# Altium footprint library Custom1.PcbLib: 554 footprints (part 25 of 35)
Each footprint in its own frame and in the unit in brackets; x right, y up, seen from the top. Pads: shape width x height; smd on the part's side, far side on the other; paste and mask are expansions set on the pad; w line width, h text height; cw(c..) or ccw(c..) is an arc to the next point about the centre after c.
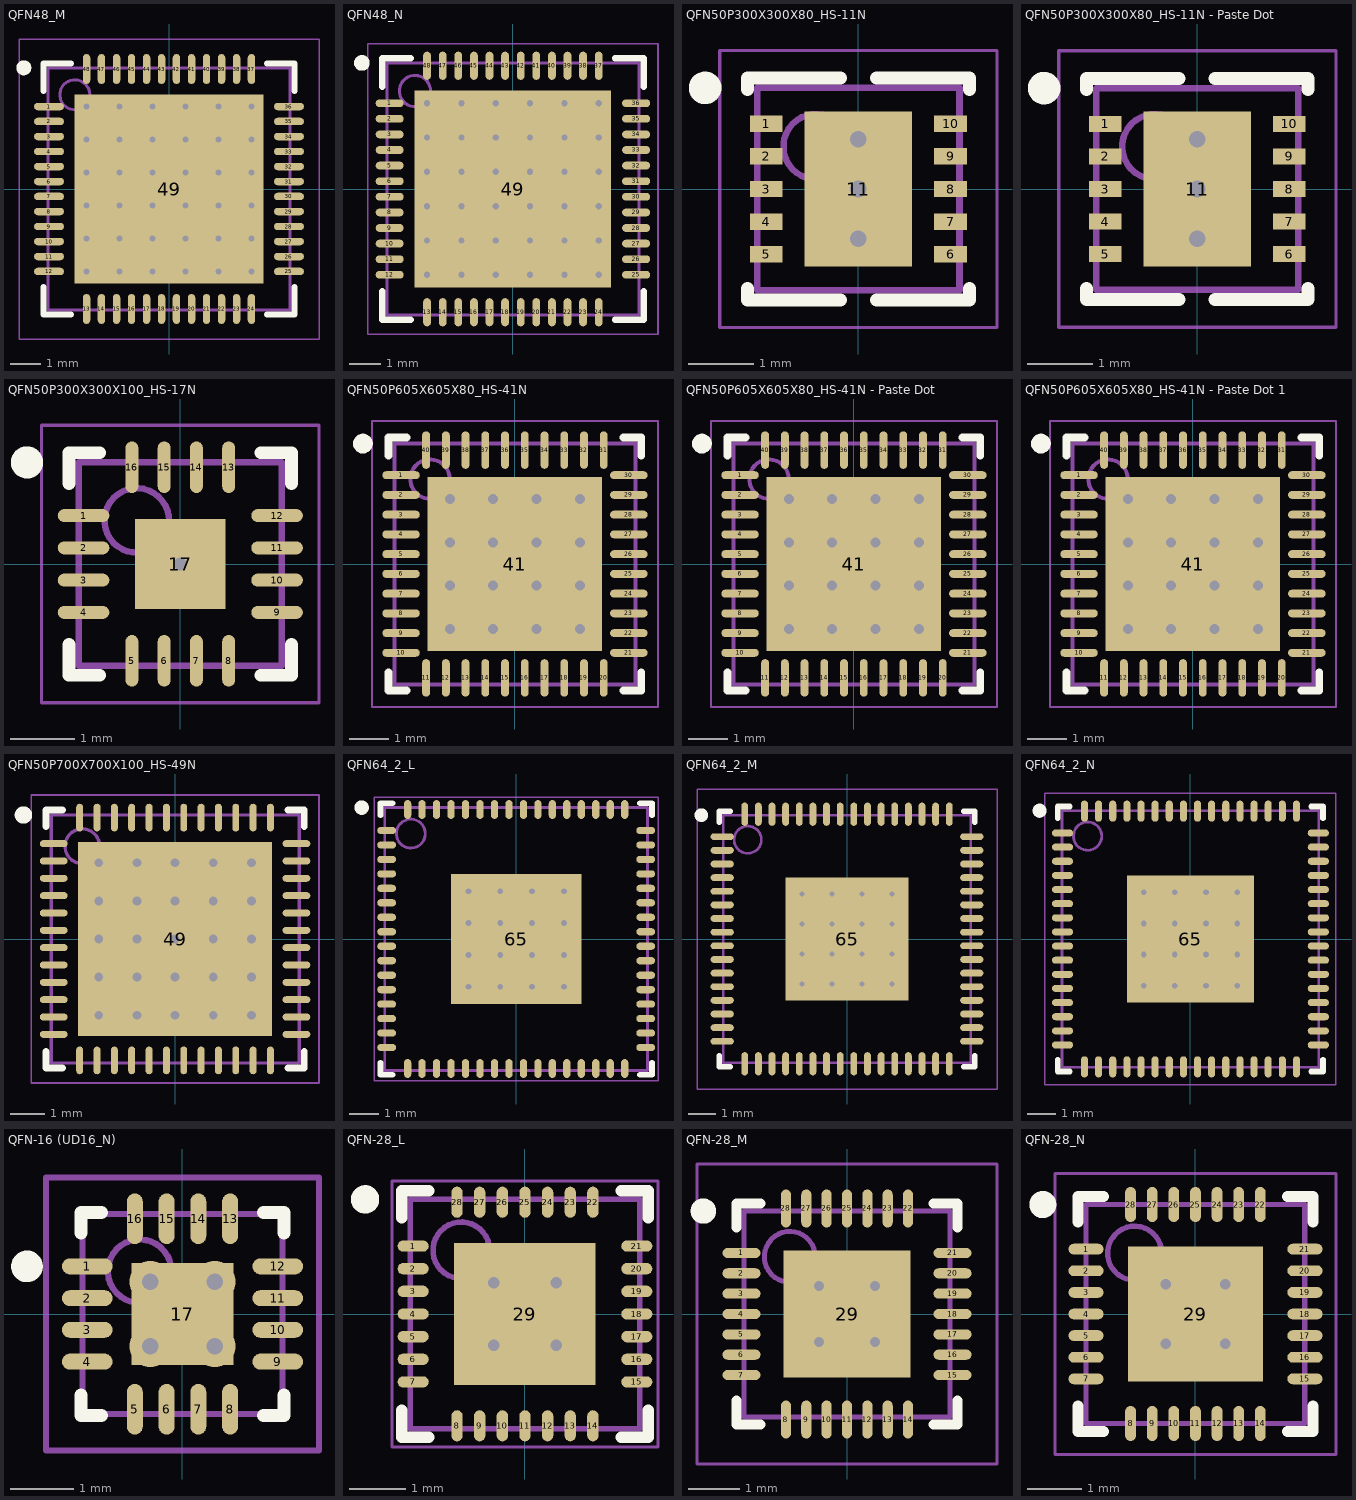
[diagram p24: the footprints below, top view; thin cyan lines are the x and y axes]

## QFN48_M [mm] "QFN, 48-Leads, Body 8x8mm, Pitch 0.5mm, Thermal Pad 6.3x6.3mm, IPC Low Density"
height 1
pads (49):
  oval 1x0.25 smd: 1(-4,2.75) 2(-4,2.25) 3(-4,1.75) 4(-4,1.25) 5(-4,0.75) 6(-4,0.25) 7(-4,-0.25) 8(-4,-0.75) 9(-4,-1.25) 10(-4,-1.75) 11(-4,-2.25) 12(-4,-2.75) 25(4,-2.75) 26(4,-2.25) 27(4,-1.75) 28(4,-1.25) 29(4,-0.75) 30(4,-0.25) 31(4,0.25) 32(4,0.75) 33(4,1.25) 34(4,1.75) 35(4,2.25) 36(4,2.75)
  oval 0.25x1 smd: 13(-2.75,-4) 14(-2.25,-4) 15(-1.75,-4) 16(-1.25,-4) 17(-0.75,-4) 18(-0.25,-4) 19(0.25,-4) 20(0.75,-4) 21(1.25,-4) 22(1.75,-4) 23(2.25,-4) 24(2.75,-4) 37(2.75,4) 38(2.25,4) 39(1.75,4) 40(1.25,4) 41(0.75,4) 42(0.25,4) 43(-0.25,4) 44(-0.75,4) 45(-1.25,4) 46(-1.75,4) 47(-2.25,4) 48(-2.75,4)
  rect 6.3x6.3 smd: 49(0,0)
via -2.75,2.75 diameter 0.5 hole 0.2
via -1.65,2.75 diameter 0.5 hole 0.2
via -0.55,2.75 diameter 0.5 hole 0.2
via 0.55,2.75 diameter 0.5 hole 0.2
via 1.65,2.75 diameter 0.5 hole 0.2
via 2.75,2.75 diameter 0.5 hole 0.2
via -2.75,1.65 diameter 0.5 hole 0.2
via -1.65,1.65 diameter 0.5 hole 0.2
via -0.55,1.65 diameter 0.5 hole 0.2
via 0.55,1.65 diameter 0.5 hole 0.2
via 1.65,1.65 diameter 0.5 hole 0.2
via 2.75,1.65 diameter 0.5 hole 0.2
via -2.75,0.55 diameter 0.5 hole 0.2
via -1.65,0.55 diameter 0.5 hole 0.2
via -0.55,0.55 diameter 0.5 hole 0.2
via 0.55,0.55 diameter 0.5 hole 0.2
via 1.65,0.55 diameter 0.5 hole 0.2
via 2.75,0.55 diameter 0.5 hole 0.2
via -2.75,-0.55 diameter 0.5 hole 0.2
via -1.65,-0.55 diameter 0.5 hole 0.2
via -0.55,-0.55 diameter 0.5 hole 0.2
via 0.55,-0.55 diameter 0.5 hole 0.2
via 1.65,-0.55 diameter 0.5 hole 0.2
via 2.75,-0.55 diameter 0.5 hole 0.2
via -2.75,-1.65 diameter 0.5 hole 0.2
via -1.65,-1.65 diameter 0.5 hole 0.2
via -0.55,-1.65 diameter 0.5 hole 0.2
via 0.55,-1.65 diameter 0.5 hole 0.2
via 1.65,-1.65 diameter 0.5 hole 0.2
via 2.75,-1.65 diameter 0.5 hole 0.2
via -2.75,-2.75 diameter 0.5 hole 0.2
via -1.65,-2.75 diameter 0.5 hole 0.2
via -0.55,-2.75 diameter 0.5 hole 0.2
via 0.55,-2.75 diameter 0.5 hole 0.2
via 1.65,-2.75 diameter 0.5 hole 0.2
via 2.75,-2.75 diameter 0.5 hole 0.2
Top Overlay:
  circle w0.25: c-4.84,4.04 r0.125
  lines w0.2: -4.19,-3.275 -4.19,-4.19 -3.275,-4.19 ; -4.19,3.275 -4.19,4.19 -3.275,4.19 ; 3.275,-4.19 4.19,-4.19 4.19,-3.275 ; 3.275,4.19 4.19,4.19 4.19,3.275
Mechanical 13:
  circle w0.1: c-3.14,3.14 r0.5
  lines w0.1: -4.04,-4.04 -4.04,4.04 4.04,4.04 4.04,-4.04 -4.04,-4.04
Mechanical 15:
  lines w0.05: -5,-5 -5,5 5,5 5,-5 -5,-5
  lines w0.1: -0.5,0 0.5,0 ; 0,-0.5 0,0.5
3D body: height 1, standoff 0, extent -4.04,-4.04 4.04,4.04

## QFN48_N [mm] "QFN, 48-Leads, Body 8x8mm, Pitch 0.5mm, Thermal Pad 6.3x6.3mm, IPC Medium Density"
height 1
pads (49):
  oval 0.9x0.25 smd: 1(-3.95,2.75) 2(-3.95,2.25) 3(-3.95,1.75) 4(-3.95,1.25) 5(-3.95,0.75) 6(-3.95,0.25) 7(-3.95,-0.25) 8(-3.95,-0.75) 9(-3.95,-1.25) 10(-3.95,-1.75) 11(-3.95,-2.25) 12(-3.95,-2.75) 25(3.95,-2.75) 26(3.95,-2.25) 27(3.95,-1.75) 28(3.95,-1.25) 29(3.95,-0.75) 30(3.95,-0.25) 31(3.95,0.25) 32(3.95,0.75) 33(3.95,1.25) 34(3.95,1.75) 35(3.95,2.25) 36(3.95,2.75)
  oval 0.25x0.9 smd: 13(-2.75,-3.95) 14(-2.25,-3.95) 15(-1.75,-3.95) 16(-1.25,-3.95) 17(-0.75,-3.95) 18(-0.25,-3.95) 19(0.25,-3.95) 20(0.75,-3.95) 21(1.25,-3.95) 22(1.75,-3.95) 23(2.25,-3.95) 24(2.75,-3.95) 37(2.75,3.95) 38(2.25,3.95) 39(1.75,3.95) 40(1.25,3.95) 41(0.75,3.95) 42(0.25,3.95) 43(-0.25,3.95) 44(-0.75,3.95) 45(-1.25,3.95) 46(-1.75,3.95) 47(-2.25,3.95) 48(-2.75,3.95)
  rect 6.3x6.3 smd: 49(0,0)
via -2.75,2.75 diameter 0.5 hole 0.2
via -1.65,2.75 diameter 0.5 hole 0.2
via -0.55,2.75 diameter 0.5 hole 0.2
via 0.55,2.75 diameter 0.5 hole 0.2
via 1.65,2.75 diameter 0.5 hole 0.2
via 2.75,2.75 diameter 0.5 hole 0.2
via -2.75,1.65 diameter 0.5 hole 0.2
via -1.65,1.65 diameter 0.5 hole 0.2
via -0.55,1.65 diameter 0.5 hole 0.2
via 0.55,1.65 diameter 0.5 hole 0.2
via 1.65,1.65 diameter 0.5 hole 0.2
via 2.75,1.65 diameter 0.5 hole 0.2
via -2.75,0.55 diameter 0.5 hole 0.2
via -1.65,0.55 diameter 0.5 hole 0.2
via -0.55,0.55 diameter 0.5 hole 0.2
via 0.55,0.55 diameter 0.5 hole 0.2
via 1.65,0.55 diameter 0.5 hole 0.2
via 2.75,0.55 diameter 0.5 hole 0.2
via -2.75,-0.55 diameter 0.5 hole 0.2
via -1.65,-0.55 diameter 0.5 hole 0.2
via -0.55,-0.55 diameter 0.5 hole 0.2
via 0.55,-0.55 diameter 0.5 hole 0.2
via 1.65,-0.55 diameter 0.5 hole 0.2
via 2.75,-0.55 diameter 0.5 hole 0.2
via -2.75,-1.65 diameter 0.5 hole 0.2
via -1.65,-1.65 diameter 0.5 hole 0.2
via -0.55,-1.65 diameter 0.5 hole 0.2
via 0.55,-1.65 diameter 0.5 hole 0.2
via 1.65,-1.65 diameter 0.5 hole 0.2
via 2.75,-1.65 diameter 0.5 hole 0.2
via -2.75,-2.75 diameter 0.5 hole 0.2
via -1.65,-2.75 diameter 0.5 hole 0.2
via -0.55,-2.75 diameter 0.5 hole 0.2
via 0.55,-2.75 diameter 0.5 hole 0.2
via 1.65,-2.75 diameter 0.5 hole 0.2
via 2.75,-2.75 diameter 0.5 hole 0.2
Top Overlay:
  circle w0.25: c-4.84,4.04 r0.125
  lines w0.2: -4.19,-3.275 -4.19,-4.19 -3.275,-4.19 ; -4.19,3.275 -4.19,4.19 -3.275,4.19 ; 3.275,-4.19 4.19,-4.19 4.19,-3.275 ; 3.275,4.19 4.19,4.19 4.19,3.275
Mechanical 13:
  circle w0.1: c-3.14,3.14 r0.5
  lines w0.1: -4.04,-4.04 -4.04,4.04 4.04,4.04 4.04,-4.04 -4.04,-4.04
Mechanical 15:
  lines w0.05: -4.65,-4.65 -4.65,4.65 4.65,4.65 4.65,-4.65 -4.65,-4.65
  lines w0.1: -0.5,0 0.5,0 ; 0,-0.5 0,0.5
3D body: height 1, standoff 0, extent -4.04,-4.04 4.04,4.04

## QFN50P300X300X80_HS-11N [mm] "QFN, 10-Leads, Body 3.00x3.00mm, Pitch 0.50mm, Thermal Pad 2.38x1.65mm, IPC Medium Density"
height 0.8
pads (12):
  rect 0.025x0.025 on Mech13 paste+0 mask+0.076: 0(0,0)
  rect 0.5x0.25 smd paste-0.025 mask+0.064: 1(-1.412,1) 2(-1.412,0.5) 3(-1.412,0) 4(-1.412,-0.5) 5(-1.412,-1) 6(1.412,-1) 7(1.412,-0.5) 8(1.412,0) 9(1.412,0.5) 10(1.412,1)
  rect 1.65x2.38 smd paste-0.838 mask+0.064: 11(0,0)
via 0,-0.762 diameter 0.66 hole 0.254
via 0,0.762 diameter 0.66 hole 0.254
via 0,0 diameter 0.66 hole 0.254
Top Overlay:
  circle w0.25: c-2.35,1.55 r0.125
  lines w0.2: -1.7,-1.525 -1.7,-1.7 -0.275,-1.7 ; -1.7,1.525 -1.7,1.7 -0.275,1.7 ; 0.275,-1.7 1.7,-1.7 1.7,-1.525 ; 0.275,1.7 1.7,1.7 1.7,1.525
Top Paste:
  circle w0.254: c-0.533,0.889 r0.127
  circle w0.254: c0.533,0.889 r0.127
  circle w0.254: c0,-0.381 r0.127
  circle w0.254: c0,0.381 r0.127
  circle w0.254: c0.533,0 r0.127
  circle w0.254: c-0.533,0 r0.127
  circle w0.254: c-0.533,-0.889 r0.127
  circle w0.254: c0.533,-0.914 r0.127
  lines w0.254: -0.533,-1.016 -0.533,0.889 ; 0.533,-0.787 0.533,0.889
Mechanical 13:
  circle w0.1: c-0.65,0.65 r0.5
  lines w0.1: -1.55,-1.55 1.55,-1.55 1.55,1.55 -1.55,1.55 -1.55,-1.55
Mechanical 15:
  lines w0.05: -2.125,-2.125 2.125,-2.125 2.125,2.125 -2.125,2.125 -2.125,-2.125
  lines w0.1: -0.5,0 0.5,0 ; 0,-0.5 0,0.5
3D body: height 0.8, standoff 0.01, extent -1.55,-1.576 1.55,1.524

## QFN50P300X300X80_HS-11N - Paste Dot [mm] "QFN, 10-Leads, Body 3.00x3.00mm, Pitch 0.50mm, Thermal Pad 2.38x1.65mm, IPC Medium Density"
height 0.8
pads (12):
  rect 0.025x0.025 on Mech13 paste+0 mask+0.076: 0(0,0)
  rect 0.5x0.25 smd paste-0.025 mask+0.064: 1(-1.412,1) 2(-1.412,0.5) 3(-1.412,0) 4(-1.412,-0.5) 5(-1.412,-1) 6(1.412,-1) 7(1.412,-0.5) 8(1.412,0) 9(1.412,0.5) 10(1.412,1)
  rect 1.65x2.38 smd paste-1.194 mask+0.064: 11(0,0)
via 0,-0.762 diameter 0.66 hole 0.254
via 0,0.762 diameter 0.66 hole 0.254
via 0,0 diameter 0.66 hole 0.254
Top Overlay:
  circle w0.25: c-2.35,1.55 r0.125
  lines w0.2: -1.7,-1.525 -1.7,-1.7 -0.275,-1.7 ; -1.7,1.525 -1.7,1.7 -0.275,1.7 ; 0.275,-1.7 1.7,-1.7 1.7,-1.525 ; 0.275,1.7 1.7,1.7 1.7,1.525
Top Paste:
  circle w0.356: c-0.483,-0.762 r0.127
  circle w0.356: c0.483,-0.762 r0.127
  circle w0.356: c0.483,0 r0.127
  circle w0.356: c-0.483,0.762 r0.127
  circle w0.356: c-0.483,0 r0.127
  circle w0.356: c0.483,0.762 r0.127
  circle w0.254: c0,-0.381 r0.102
  circle w0.254: c0,0.381 r0.102
Mechanical 13:
  circle w0.1: c-0.65,0.65 r0.5
  lines w0.1: -1.55,-1.55 1.55,-1.55 1.55,1.55 -1.55,1.55 -1.55,-1.55
Mechanical 15:
  lines w0.05: -2.125,-2.125 2.134,-2.125 2.134,2.125 -2.125,2.125 -2.125,-2.125
  lines w0.1: -0.5,0 0.5,0 ; 0,-0.5 0,0.5
3D body: height 0.8, standoff 0.01, extent -1.55,-1.576 1.55,1.524

## QFN50P300X300X100_HS-17N [mm] "QFN, 16-Leads, Body 3.00x3.00mm, Pitch 0.50mm, Thermal Pad 1.40x1.40mm, IPC Medium Density"
height 1
pads (17):
  oval 0.8x0.2 smd: 1(-1.5,0.75) 2(-1.5,0.25) 3(-1.5,-0.25) 4(-1.5,-0.75) 9(1.5,-0.75) 10(1.5,-0.25) 11(1.5,0.25) 12(1.5,0.75)
  oval 0.2x0.8 smd: 5(-0.75,-1.5) 6(-0.25,-1.5) 7(0.25,-1.5) 8(0.75,-1.5) 13(0.75,1.5) 14(0.25,1.5) 15(-0.25,1.5) 16(-0.75,1.5)
  rect 1.4x1.4 smd: 17(0,0)
via 0,0 diameter 0.5 hole 0.2
Top Overlay:
  circle w0.25: c-2.375,1.575 r0.125
  lines w0.2: -1.725,-1.25 -1.725,-1.725 -1.25,-1.725 ; -1.725,1.25 -1.725,1.725 -1.25,1.725 ; 1.25,-1.725 1.725,-1.725 1.725,-1.25 ; 1.25,1.725 1.725,1.725 1.725,1.25
Mechanical 13:
  circle w0.1: c-0.675,0.675 r0.5
  lines w0.1: -1.575,-1.575 1.575,-1.575 1.575,1.575 -1.575,1.575 -1.575,-1.575
Mechanical 15:
  lines w0.05: -2.15,-2.15 2.15,-2.15 2.15,2.15 -2.15,2.15 -2.15,-2.15
  lines w0.1: -0.5,0 0.5,0 ; 0,-0.5 0,0.5
3D body: height 1, standoff 0.08, extent -1.575,-1.575 1.575,1.575

## QFN50P605X605X80_HS-41N [mm] "QFN, 40-Leads, Body 6.05x6.05mm, Pitch 0.50mm, Thermal Pad 4.42x4.42mm, IPC Medium Density"
height 0.8
pads (41):
  oval 0.95x0.2 smd paste-0.025 mask+0.051: 1(-2.885,2.25) 2(-2.885,1.75) 3(-2.885,1.25) 4(-2.885,0.75) 5(-2.885,0.25) 6(-2.885,-0.25) 7(-2.885,-0.75) 8(-2.885,-1.25) 9(-2.885,-1.75) 10(-2.885,-2.25) 21(2.885,-2.25) 22(2.885,-1.75) 23(2.885,-1.25) 24(2.885,-0.75) 25(2.885,-0.25) 26(2.885,0.25) 27(2.885,0.75) 28(2.885,1.25) 29(2.885,1.75) 30(2.885,2.25)
  oval 0.2x0.95 smd paste-0.025 mask+0.051: 11(-2.25,-2.885) 12(-1.75,-2.885) 13(-1.25,-2.885) 14(-0.75,-2.885) 15(-0.25,-2.885) 16(0.25,-2.885) 17(0.75,-2.885) 18(1.25,-2.885) 19(1.75,-2.885) 20(2.25,-2.885) 31(2.25,2.885) 32(1.75,2.885) 33(1.25,2.885) 34(0.75,2.885) 35(0.25,2.885) 36(-0.25,2.885) 37(-0.75,2.885) 38(-1.25,2.885) 39(-1.75,2.885) 40(-2.25,2.885)
  rect 4.42x4.42 smd paste-0.025 mask+0.051: 41(0,0)
via -1.65,1.65 diameter 0.66 hole 0.254
via -0.55,1.65 diameter 0.66 hole 0.254
via 0.55,1.65 diameter 0.66 hole 0.254
via 1.65,1.65 diameter 0.66 hole 0.254
via -1.65,0.55 diameter 0.66 hole 0.254
via -0.55,0.55 diameter 0.66 hole 0.254
via 0.55,0.55 diameter 0.66 hole 0.254
via 1.65,0.55 diameter 0.66 hole 0.254
via -1.65,-0.55 diameter 0.66 hole 0.254
via -0.55,-0.55 diameter 0.66 hole 0.254
via 0.55,-0.55 diameter 0.66 hole 0.254
via 1.65,-0.55 diameter 0.66 hole 0.254
via -1.65,-1.65 diameter 0.66 hole 0.254
via -0.55,-1.65 diameter 0.66 hole 0.254
via 0.55,-1.65 diameter 0.66 hole 0.254
via 1.65,-1.65 diameter 0.66 hole 0.254
Top Overlay:
  circle w0.25: c-3.85,3.05 r0.125
  lines w0.2: -3.2,-2.75 -3.2,-3.2 -2.75,-3.2 ; -3.2,2.75 -3.2,3.2 -2.75,3.2 ; 2.75,-3.2 3.2,-3.2 3.2,-2.75 ; 2.75,3.2 3.2,3.2 3.2,2.75
Mechanical 13:
  circle w0.1: c-2.15,2.15 r0.5
  lines w0.1: -3.05,-3.05 -3.05,3.05 3.05,3.05 3.05,-3.05 -3.05,-3.05
Mechanical 15:
  lines w0.05: -3.625,-3.625 -3.625,3.625 3.625,3.625 3.625,-3.625 -3.625,-3.625
  lines w0.1: -0.5,0 0.5,0 ; 0,-0.5 0,0.5
3D body: height 0.8, standoff 0, extent -3.05,-3.05 3.05,3.05

## QFN50P605X605X80_HS-41N - Paste Dot [mm] "QFN, 40-Leads, Body 6.05x6.05mm, Pitch 0.50mm, Thermal Pad 4.42x4.42mm, IPC Medium Density"
height 0.8
pads (41):
  oval 0.95x0.2 smd paste-0.025 mask+0.051: 1(-2.885,2.25) 2(-2.885,1.75) 3(-2.885,1.25) 4(-2.885,0.75) 5(-2.885,0.25) 6(-2.885,-0.25) 7(-2.885,-0.75) 8(-2.885,-1.25) 9(-2.885,-1.75) 10(-2.885,-2.25) 21(2.885,-2.25) 22(2.885,-1.75) 23(2.885,-1.25) 24(2.885,-0.75) 25(2.885,-0.25) 26(2.885,0.25) 27(2.885,0.75) 28(2.885,1.25) 29(2.885,1.75) 30(2.885,2.25)
  oval 0.2x0.95 smd paste-0.025 mask+0.051: 11(-2.25,-2.885) 12(-1.75,-2.885) 13(-1.25,-2.885) 14(-0.75,-2.885) 15(-0.25,-2.885) 16(0.25,-2.885) 17(0.75,-2.885) 18(1.25,-2.885) 19(1.75,-2.885) 20(2.25,-2.885) 31(2.25,2.885) 32(1.75,2.885) 33(1.25,2.885) 34(0.75,2.885) 35(0.25,2.885) 36(-0.25,2.885) 37(-0.75,2.885) 38(-1.25,2.885) 39(-1.75,2.885) 40(-2.25,2.885)
  rect 4.42x4.42 smd paste-2.21 mask+0.051: 41(0,0)
via -1.65,1.65 diameter 0.66 hole 0.254
via -0.55,1.65 diameter 0.66 hole 0.254
via 0.55,1.65 diameter 0.66 hole 0.254
via 1.65,1.65 diameter 0.66 hole 0.254
via -1.65,0.55 diameter 0.66 hole 0.254
via -0.55,0.55 diameter 0.66 hole 0.254
via 0.55,0.55 diameter 0.66 hole 0.254
via 1.65,0.55 diameter 0.66 hole 0.254
via -1.65,-0.55 diameter 0.66 hole 0.254
via -0.55,-0.55 diameter 0.66 hole 0.254
via 0.55,-0.55 diameter 0.66 hole 0.254
via 1.65,-0.55 diameter 0.66 hole 0.254
via -1.65,-1.65 diameter 0.66 hole 0.254
via -0.55,-1.65 diameter 0.66 hole 0.254
via 0.55,-1.65 diameter 0.66 hole 0.254
via 1.65,-1.65 diameter 0.66 hole 0.254
Top Overlay:
  circle w0.25: c-3.85,3.05 r0.125
  lines w0.2: -3.2,-2.75 -3.2,-3.2 -2.75,-3.2 ; -3.2,2.75 -3.2,3.2 -2.75,3.2 ; 2.75,-3.2 3.2,-3.2 3.2,-2.75 ; 2.75,3.2 3.2,3.2 3.2,2.75
Top Paste:
  circle w0.508: c-1.118,1.118 r0.254
  circle w0.508: c1.118,-1.118 r0.254
  circle w0.508: c0,1.118 r0.254
  circle w0.508: c1.118,1.118 r0.254
  circle w0.508: c-1.118,0 r0.254
  circle w0.508: c1.118,0 r0.254
  circle w0.508: c0,0 r0.254
  circle w0.508: c0,-1.118 r0.254
  lines w0.508: -0.864,-1.118 cw(c-1.118,-1.118) -0.864,-1.105
Mechanical 13:
  circle w0.1: c-2.15,2.15 r0.5
  lines w0.1: -3.05,-3.05 -3.05,3.05 3.05,3.05 3.05,-3.05 -3.05,-3.05
Mechanical 15:
  lines w0.05: -3.625,-3.625 -3.625,3.625 3.625,3.625 3.625,-3.625 -3.625,-3.625
  lines w0.1: -0.5,0 0.5,0 ; 0,-0.5 0,0.5
3D body: height 0.8, standoff 0, extent -3.05,-3.05 3.05,3.05

## QFN50P605X605X80_HS-41N - Paste Dot 1 [mm] "QFN, 40-Leads, Body 6.05x6.05mm, Pitch 0.50mm, Thermal Pad 4.42x4.42mm, IPC Medium Density"
height 0.8
pads (41):
  oval 0.95x0.2 smd paste-0.025 mask+0.051: 1(-2.885,2.25) 2(-2.885,1.75) 3(-2.885,1.25) 4(-2.885,0.75) 5(-2.885,0.25) 6(-2.885,-0.25) 7(-2.885,-0.75) 8(-2.885,-1.25) 9(-2.885,-1.75) 10(-2.885,-2.25) 21(2.885,-2.25) 22(2.885,-1.75) 23(2.885,-1.25) 24(2.885,-0.75) 25(2.885,-0.25) 26(2.885,0.25) 27(2.885,0.75) 28(2.885,1.25) 29(2.885,1.75) 30(2.885,2.25)
  oval 0.2x0.95 smd paste-0.025 mask+0.051: 11(-2.25,-2.885) 12(-1.75,-2.885) 13(-1.25,-2.885) 14(-0.75,-2.885) 15(-0.25,-2.885) 16(0.25,-2.885) 17(0.75,-2.885) 18(1.25,-2.885) 19(1.75,-2.885) 20(2.25,-2.885) 31(2.25,2.885) 32(1.75,2.885) 33(1.25,2.885) 34(0.75,2.885) 35(0.25,2.885) 36(-0.25,2.885) 37(-0.75,2.885) 38(-1.25,2.885) 39(-1.75,2.885) 40(-2.25,2.885)
  rect 4.42x4.42 smd paste-2.21 mask+0.051: 41(0,0)
via 1.65,-1.65 diameter 0.66 hole 0.254
via 0.55,-1.65 diameter 0.66 hole 0.254
via -0.55,-1.65 diameter 0.66 hole 0.254
via -1.65,-1.65 diameter 0.66 hole 0.254
via 1.65,-0.55 diameter 0.66 hole 0.254
via 0.55,-0.55 diameter 0.66 hole 0.254
via -0.55,-0.55 diameter 0.66 hole 0.254
via -1.65,-0.55 diameter 0.66 hole 0.254
via 1.65,0.55 diameter 0.66 hole 0.254
via 0.55,0.55 diameter 0.66 hole 0.254
via -0.55,0.55 diameter 0.66 hole 0.254
via -1.65,0.55 diameter 0.66 hole 0.254
via 1.65,1.65 diameter 0.66 hole 0.254
via 0.55,1.65 diameter 0.66 hole 0.254
via -0.55,1.65 diameter 0.66 hole 0.254
via -1.65,1.65 diameter 0.66 hole 0.254
Top Overlay:
  circle w0.25: c-3.85,3.05 r0.125
  lines w0.2: -3.2,-2.75 -3.2,-3.2 -2.75,-3.2 ; -3.2,2.75 -3.2,3.2 -2.75,3.2 ; 2.75,-3.2 3.2,-3.2 3.2,-2.75 ; 2.75,3.2 3.2,3.2 3.2,2.75
Top Paste:
  circle w0.254: c-1.651,1.092 r0.076
  circle w0.254: c-1.092,1.092 r0.127
  circle w0.254: c0,0 r0.127
  circle w0.254: c1.092,1.092 r0.127
  circle w0.254: c0,1.092 r0.127
  circle w0.254: c-1.092,-1.092 r0.127
  circle w0.254: c1.092,-1.092 r0.127
  circle w0.254: c0,-1.092 r0.127
  circle w0.254: c1.092,0 r0.127
  circle w0.254: c-1.092,0 r0.127
  circle w0.254: c1.651,-1.092 r0.076
  circle w0.254: c-1.651,0 r0.076
  circle w0.254: c1.092,1.651 r0.076
  circle w0.254: c-1.092,1.651 r0.076
  circle w0.254: c1.651,1.092 r0.076
  circle w0.254: c1.651,0 r0.076
  circle w0.254: c0,1.651 r0.076
  circle w0.254: c-1.092,0.533 r0.076
  circle w0.254: c0,0.533 r0.076
  circle w0.254: c-0.559,1.092 r0.076
  circle w0.254: c0,-1.651 r0.076
  circle w0.254: c-1.092,-1.651 r0.076
  circle w0.254: c-1.651,-1.092 r0.076
  circle w0.254: c1.092,-1.651 r0.076
  circle w0.254: c-0.559,0 r0.076
  circle w0.254: c0.559,0 r0.076
  circle w0.254: c0.559,1.092 r0.076
  circle w0.254: c1.092,0.559 r0.076
  circle w0.254: c1.092,-0.559 r0.076
  circle w0.254: c-1.092,-0.559 r0.076
  circle w0.254: c0,-0.559 r0.076
  circle w0.254: c0.559,-1.092 r0.076
  circle w0.254: c-0.559,-1.092 r0.076
Mechanical 13:
  circle w0.1: c-2.15,2.15 r0.5
  lines w0.1: -3.05,-3.05 3.05,-3.05 3.05,3.05 -3.05,3.05 -3.05,-3.05
Mechanical 15:
  lines w0.05: -3.625,-3.625 3.625,-3.625 3.625,3.625 -3.625,3.625 -3.625,-3.625
  lines w0.1: -0.5,0 0.5,0 ; 0,-0.5 0,0.5
3D body: height 0.8, standoff 0, extent -3.05,-3.05 3.05,3.05

## QFN50P700X700X100_HS-49N [mm] "QFN, 48-Leads, Body 7.00x7.00mm, Pitch 0.50mm, Thermal Pad 5.60x5.60mm, IPC Medium Density"
height 1
pads (49):
  oval 0.8x0.2 smd: 1(-3.5,2.75) 2(-3.5,2.25) 3(-3.5,1.75) 4(-3.5,1.25) 5(-3.5,0.75) 6(-3.5,0.25) 7(-3.5,-0.25) 8(-3.5,-0.75) 9(-3.5,-1.25) 10(-3.5,-1.75) 11(-3.5,-2.25) 12(-3.5,-2.75) 25(3.5,-2.75) 26(3.5,-2.25) 27(3.5,-1.75) 28(3.5,-1.25) 29(3.5,-0.75) 30(3.5,-0.25) 31(3.5,0.25) 32(3.5,0.75) 33(3.5,1.25) 34(3.5,1.75) 35(3.5,2.25) 36(3.5,2.75)
  oval 0.2x0.8 smd: 13(-2.75,-3.5) 14(-2.25,-3.5) 15(-1.75,-3.5) 16(-1.25,-3.5) 17(-0.75,-3.5) 18(-0.25,-3.5) 19(0.25,-3.5) 20(0.75,-3.5) 21(1.25,-3.5) 22(1.75,-3.5) 23(2.25,-3.5) 24(2.75,-3.5) 37(2.75,3.5) 38(2.25,3.5) 39(1.75,3.5) 40(1.25,3.5) 41(0.75,3.5) 42(0.25,3.5) 43(-0.25,3.5) 44(-0.75,3.5) 45(-1.25,3.5) 46(-1.75,3.5) 47(-2.25,3.5) 48(-2.75,3.5)
  rect 5.6x5.6 smd paste-2.794: 49(0,0)
via -2.2,2.2 diameter 0.508 hole 0.254
via -1.1,2.2 diameter 0.508 hole 0.254
via 0,2.2 diameter 0.508 hole 0.254
via 1.1,2.2 diameter 0.508 hole 0.254
via 2.2,2.2 diameter 0.508 hole 0.254
via -2.2,1.1 diameter 0.508 hole 0.254
via -1.1,1.1 diameter 0.508 hole 0.254
via 0,1.1 diameter 0.508 hole 0.254
via 1.1,1.1 diameter 0.508 hole 0.254
via 2.2,1.1 diameter 0.508 hole 0.254
via -2.2,0 diameter 0.508 hole 0.254
via -1.1,0 diameter 0.508 hole 0.254
via 0,0 diameter 0.508 hole 0.254
via 1.1,0 diameter 0.508 hole 0.254
via 2.2,0 diameter 0.508 hole 0.254
via -2.2,-1.1 diameter 0.508 hole 0.254
via -1.1,-1.1 diameter 0.508 hole 0.254
via 0,-1.1 diameter 0.508 hole 0.254
via 1.1,-1.1 diameter 0.508 hole 0.254
via 2.2,-1.1 diameter 0.508 hole 0.254
via -2.2,-2.2 diameter 0.508 hole 0.254
via -1.1,-2.2 diameter 0.508 hole 0.254
via 0,-2.2 diameter 0.508 hole 0.254
via 1.1,-2.2 diameter 0.508 hole 0.254
via 2.2,-2.2 diameter 0.508 hole 0.254
Top Overlay:
  circle w0.25: c-4.375,3.575 r0.125
  lines w0.2: -3.725,-3.25 -3.725,-3.725 -3.25,-3.725 ; -3.725,3.25 -3.725,3.725 -3.25,3.725 ; 3.25,-3.725 3.725,-3.725 3.725,-3.25 ; 3.25,3.725 3.725,3.725 3.725,3.25
Top Paste:
  circle w0.635: c-1.65,1.65 r0.202
  circle w0.635: c-1.65,0.55 r0.202
  circle w0.635: c-1.65,-0.55 r0.202
  circle w0.635: c-1.65,-1.65 r0.202
  circle w0.635: c1.648,-1.65 r0.202
  circle w0.635: c1.648,-0.55 r0.202
  circle w0.635: c1.648,0.55 r0.202
  circle w0.635: c1.648,1.65 r0.202
  circle w0.635: c-0.55,-1.65 r0.202
  circle w0.635: c-0.55,-0.55 r0.202
  circle w0.635: c-0.55,0.55 r0.202
  circle w0.635: c-0.55,1.65 r0.202
  circle w0.635: c0.55,1.65 r0.202
  circle w0.635: c0.55,0.55 r0.202
  circle w0.635: c0.55,-0.55 r0.202
  circle w0.635: c0.55,-1.65 r0.202
  circle w0.254: c-0.55,2.525 r0.1
  circle w0.254: c-1.65,2.525 r0.1
  circle w0.254: c0.55,2.525 r0.1
  circle w0.254: c1.65,2.525 r0.1
  circle w0.254: c2.525,1.65 r0.1
  circle w0.254: c2.525,0.55 r0.1
  circle w0.254: c2.525,-0.55 r0.1
  circle w0.254: c2.525,-1.65 r0.1
  circle w0.254: c1.65,-2.525 r0.1
  circle w0.254: c0.55,-2.525 r0.1
  circle w0.254: c-0.55,-2.525 r0.1
  circle w0.254: c-1.65,-2.525 r0.1
  circle w0.254: c-2.525,-1.65 r0.1
  circle w0.254: c-2.525,-0.55 r0.1
  circle w0.254: c-2.525,0.55 r0.1
  circle w0.254: c-2.525,1.65 r0.1
Mechanical 13:
  circle w0.1: c-2.675,2.675 r0.5
  lines w0.1: -3.575,-3.575 -3.575,3.575 3.575,3.575 3.575,-3.575 -3.575,-3.575
Mechanical 15:
  lines w0.05: -4.15,-4.15 -4.15,4.15 4.15,4.15 4.15,-4.15 -4.15,-4.15
  lines w0.1: -0.5,0 0.5,0 ; 0,-0.5 0,0.5
3D body: height 1, standoff 0.08, extent -3.575,-3.575 3.575,3.575

## QFN64_2_L [mm] "QFN, 64-Leads, Body 9x9mm, Pitch 0.5mm, Thermal Pad 4.5x4.5mm, IPC High Density"
height 1
pads (65):
  oval 0.65x0.25 smd: 1(-4.475,3.75) 2(-4.475,3.25) 3(-4.475,2.75) 4(-4.475,2.25) 5(-4.475,1.75) 6(-4.475,1.25) 7(-4.475,0.75) 8(-4.475,0.25) 9(-4.475,-0.25) 10(-4.475,-0.75) 11(-4.475,-1.25) 12(-4.475,-1.75) 13(-4.475,-2.25) 14(-4.475,-2.75) 15(-4.475,-3.25) 16(-4.475,-3.75) 33(4.475,-3.75) 34(4.475,-3.25) 35(4.475,-2.75) 36(4.475,-2.25) 37(4.475,-1.75) 38(4.475,-1.25) 39(4.475,-0.75) 40(4.475,-0.25) 41(4.475,0.25) 42(4.475,0.75) 43(4.475,1.25) 44(4.475,1.75) 45(4.475,2.25) 46(4.475,2.75) 47(4.475,3.25) 48(4.475,3.75)
  oval 0.25x0.65 smd: 17(-3.75,-4.475) 18(-3.25,-4.475) 19(-2.75,-4.475) 20(-2.25,-4.475) 21(-1.75,-4.475) 22(-1.25,-4.475) 23(-0.75,-4.475) 24(-0.25,-4.475) 25(0.25,-4.475) 26(0.75,-4.475) 27(1.25,-4.475) 28(1.75,-4.475) 29(2.25,-4.475) 30(2.75,-4.475) 31(3.25,-4.475) 32(3.75,-4.475) 49(3.75,4.475) 50(3.25,4.475) 51(2.75,4.475) 52(2.25,4.475) 53(1.75,4.475) 54(1.25,4.475) 55(0.75,4.475) 56(0.25,4.475) 57(-0.25,4.475) 58(-0.75,4.475) 59(-1.25,4.475) 60(-1.75,4.475) 61(-2.25,4.475) 62(-2.75,4.475) 63(-3.25,4.475) 64(-3.75,4.475)
  rect 4.5x4.5 smd: 65(0,0)
via 1.65,-1.65 diameter 0.5 hole 0.2
via 0.55,-1.65 diameter 0.5 hole 0.2
via -0.55,-1.65 diameter 0.5 hole 0.2
via -1.65,-1.65 diameter 0.5 hole 0.2
via 1.65,-0.55 diameter 0.5 hole 0.2
via 0.55,-0.55 diameter 0.5 hole 0.2
via -0.55,-0.55 diameter 0.5 hole 0.2
via -1.65,-0.55 diameter 0.5 hole 0.2
via 1.65,0.55 diameter 0.5 hole 0.2
via 0.55,0.55 diameter 0.5 hole 0.2
via -0.55,0.55 diameter 0.5 hole 0.2
via -1.65,0.55 diameter 0.5 hole 0.2
via 1.65,1.65 diameter 0.5 hole 0.2
via 0.55,1.65 diameter 0.5 hole 0.2
via -0.55,1.65 diameter 0.5 hole 0.2
via -1.65,1.65 diameter 0.5 hole 0.2
Top Overlay:
  circle w0.25: c-5.34,4.54 r0.125
  lines w0.2: -4.69,-4.275 -4.69,-4.69 -4.275,-4.69 ; -4.69,4.275 -4.69,4.69 -4.275,4.69 ; 4.275,-4.69 4.69,-4.69 4.69,-4.275 ; 4.275,4.69 4.69,4.69 4.69,4.275
Mechanical 13:
  circle w0.1: c-3.64,3.64 r0.5
  lines w0.1: -4.54,-4.54 4.54,-4.54 4.54,4.54 -4.54,4.54 -4.54,-4.54
Mechanical 15:
  lines w0.05: -4.9,-4.9 4.9,-4.9 4.9,4.9 -4.9,4.9 -4.9,-4.9
  lines w0.1: -0.5,0 0.5,0 ; 0,-0.5 0,0.5
3D body: height 1, standoff 0, extent -4.54,-4.54 4.54,4.54

## QFN64_2_M [mm] "QFN, 64-Leads, Body 9x9mm, Pitch 0.5mm, Thermal Pad 4.5x4.5mm, IPC Low Density"
height 1
pads (65):
  oval 0.85x0.25 smd: 1(-4.575,3.75) 2(-4.575,3.25) 3(-4.575,2.75) 4(-4.575,2.25) 5(-4.575,1.75) 6(-4.575,1.25) 7(-4.575,0.75) 8(-4.575,0.25) 9(-4.575,-0.25) 10(-4.575,-0.75) 11(-4.575,-1.25) 12(-4.575,-1.75) 13(-4.575,-2.25) 14(-4.575,-2.75) 15(-4.575,-3.25) 16(-4.575,-3.75) 33(4.575,-3.75) 34(4.575,-3.25) 35(4.575,-2.75) 36(4.575,-2.25) 37(4.575,-1.75) 38(4.575,-1.25) 39(4.575,-0.75) 40(4.575,-0.25) 41(4.575,0.25) 42(4.575,0.75) 43(4.575,1.25) 44(4.575,1.75) 45(4.575,2.25) 46(4.575,2.75) 47(4.575,3.25) 48(4.575,3.75)
  oval 0.25x0.85 smd: 17(-3.75,-4.575) 18(-3.25,-4.575) 19(-2.75,-4.575) 20(-2.25,-4.575) 21(-1.75,-4.575) 22(-1.25,-4.575) 23(-0.75,-4.575) 24(-0.25,-4.575) 25(0.25,-4.575) 26(0.75,-4.575) 27(1.25,-4.575) 28(1.75,-4.575) 29(2.25,-4.575) 30(2.75,-4.575) 31(3.25,-4.575) 32(3.75,-4.575) 49(3.75,4.575) 50(3.25,4.575) 51(2.75,4.575) 52(2.25,4.575) 53(1.75,4.575) 54(1.25,4.575) 55(0.75,4.575) 56(0.25,4.575) 57(-0.25,4.575) 58(-0.75,4.575) 59(-1.25,4.575) 60(-1.75,4.575) 61(-2.25,4.575) 62(-2.75,4.575) 63(-3.25,4.575) 64(-3.75,4.575)
  rect 4.5x4.5 smd: 65(0,0)
via 1.65,-1.65 diameter 0.5 hole 0.2
via 0.55,-1.65 diameter 0.5 hole 0.2
via -0.55,-1.65 diameter 0.5 hole 0.2
via -1.65,-1.65 diameter 0.5 hole 0.2
via 1.65,-0.55 diameter 0.5 hole 0.2
via 0.55,-0.55 diameter 0.5 hole 0.2
via -0.55,-0.55 diameter 0.5 hole 0.2
via -1.65,-0.55 diameter 0.5 hole 0.2
via 1.65,0.55 diameter 0.5 hole 0.2
via 0.55,0.55 diameter 0.5 hole 0.2
via -0.55,0.55 diameter 0.5 hole 0.2
via -1.65,0.55 diameter 0.5 hole 0.2
via 1.65,1.65 diameter 0.5 hole 0.2
via 0.55,1.65 diameter 0.5 hole 0.2
via -0.55,1.65 diameter 0.5 hole 0.2
via -1.65,1.65 diameter 0.5 hole 0.2
Top Overlay:
  circle w0.25: c-5.34,4.54 r0.125
  lines w0.2: -4.69,-4.275 -4.69,-4.69 -4.275,-4.69 ; -4.69,4.275 -4.69,4.69 -4.275,4.69 ; 4.275,-4.69 4.69,-4.69 4.69,-4.275 ; 4.275,4.69 4.69,4.69 4.69,4.275
Mechanical 13:
  circle w0.1: c-3.64,3.64 r0.5
  lines w0.1: -4.54,-4.54 4.54,-4.54 4.54,4.54 -4.54,4.54 -4.54,-4.54
Mechanical 15:
  lines w0.05: -5.5,-5.5 5.5,-5.5 5.5,5.5 -5.5,5.5 -5.5,-5.5
  lines w0.1: -0.5,0 0.5,0 ; 0,-0.5 0,0.5
3D body: height 1, standoff 0, extent -4.54,-4.54 4.54,4.54

## QFN64_2_N [mm] "QFN, 64-Leads, Body 9x9mm, Pitch 0.5mm, Thermal Pad 4.5x4.5mm, IPC Medium Density"
height 1
pads (65):
  oval 0.75x0.25 smd: 1(-4.525,3.75) 2(-4.525,3.25) 3(-4.525,2.75) 4(-4.525,2.25) 5(-4.525,1.75) 6(-4.525,1.25) 7(-4.525,0.75) 8(-4.525,0.25) 9(-4.525,-0.25) 10(-4.525,-0.75) 11(-4.525,-1.25) 12(-4.525,-1.75) 13(-4.525,-2.25) 14(-4.525,-2.75) 15(-4.525,-3.25) 16(-4.525,-3.75) 33(4.525,-3.75) 34(4.525,-3.25) 35(4.525,-2.75) 36(4.525,-2.25) 37(4.525,-1.75) 38(4.525,-1.25) 39(4.525,-0.75) 40(4.525,-0.25) 41(4.525,0.25) 42(4.525,0.75) 43(4.525,1.25) 44(4.525,1.75) 45(4.525,2.25) 46(4.525,2.75) 47(4.525,3.25) 48(4.525,3.75)
  oval 0.25x0.75 smd: 17(-3.75,-4.525) 18(-3.25,-4.525) 19(-2.75,-4.525) 20(-2.25,-4.525) 21(-1.75,-4.525) 22(-1.25,-4.525) 23(-0.75,-4.525) 24(-0.25,-4.525) 25(0.25,-4.525) 26(0.75,-4.525) 27(1.25,-4.525) 28(1.75,-4.525) 29(2.25,-4.525) 30(2.75,-4.525) 31(3.25,-4.525) 32(3.75,-4.525) 49(3.75,4.525) 50(3.25,4.525) 51(2.75,4.525) 52(2.25,4.525) 53(1.75,4.525) 54(1.25,4.525) 55(0.75,4.525) 56(0.25,4.525) 57(-0.25,4.525) 58(-0.75,4.525) 59(-1.25,4.525) 60(-1.75,4.525) 61(-2.25,4.525) 62(-2.75,4.525) 63(-3.25,4.525) 64(-3.75,4.525)
  rect 4.5x4.5 smd: 65(0,0)
via 1.65,-1.65 diameter 0.5 hole 0.2
via 0.55,-1.65 diameter 0.5 hole 0.2
via -0.55,-1.65 diameter 0.5 hole 0.2
via -1.65,-1.65 diameter 0.5 hole 0.2
via 1.65,-0.55 diameter 0.5 hole 0.2
via 0.55,-0.55 diameter 0.5 hole 0.2
via -0.55,-0.55 diameter 0.5 hole 0.2
via -1.65,-0.55 diameter 0.5 hole 0.2
via 1.65,0.55 diameter 0.5 hole 0.2
via 0.55,0.55 diameter 0.5 hole 0.2
via -0.55,0.55 diameter 0.5 hole 0.2
via -1.65,0.55 diameter 0.5 hole 0.2
via 1.65,1.65 diameter 0.5 hole 0.2
via 0.55,1.65 diameter 0.5 hole 0.2
via -0.55,1.65 diameter 0.5 hole 0.2
via -1.65,1.65 diameter 0.5 hole 0.2
Top Overlay:
  circle w0.25: c-5.34,4.54 r0.125
  lines w0.2: -4.69,-4.275 -4.69,-4.69 -4.275,-4.69 ; -4.69,4.275 -4.69,4.69 -4.275,4.69 ; 4.275,-4.69 4.69,-4.69 4.69,-4.275 ; 4.275,4.69 4.69,4.69 4.69,4.275
Mechanical 13:
  circle w0.1: c-3.64,3.64 r0.5
  lines w0.1: -4.54,-4.54 4.54,-4.54 4.54,4.54 -4.54,4.54 -4.54,-4.54
Mechanical 15:
  lines w0.05: -5.15,-5.15 5.15,-5.15 5.15,5.15 -5.15,5.15 -5.15,-5.15
  lines w0.1: -0.5,0 0.5,0 ; 0,-0.5 0,0.5
3D body: height 1, standoff 0, extent -4.54,-4.54 4.54,4.54

## QFN-16 (UD16_N) [mm] "16-Pin Plastic Quad Flat No-Lead 0.5 mm Pitch, IPC Medium Density"
height 0.8
pads (17):
  oval 0.8x0.25 smd mask+0.051: 1(-1.5,0.75) 2(-1.5,0.25) 3(-1.5,-0.25) 4(-1.5,-0.75) 9(1.5,-0.75) 10(1.5,-0.25) 11(1.5,0.25) 12(1.5,0.75)
  oval 0.25x0.8 smd mask+0.051: 5(-0.75,-1.5) 6(-0.25,-1.5) 7(0.25,-1.5) 8(0.75,-1.5) 13(0.75,1.5) 14(0.25,1.5) 15(-0.25,1.5) 16(-0.75,1.5)
  rect 1.6x1.6 smd mask+0.051: 17(0,0)
via -0.508,-0.508 diameter 0.66 hole 0.254
via 0.508,0.508 diameter 0.66 hole 0.254
via -0.508,0.508 diameter 0.66 hole 0.254
via 0.508,-0.508 diameter 0.66 hole 0.254
Top Overlay:
  circle w0.25: c-2.45,0.75 r0.125
  lines w0.2: -1.6,-1.275 -1.6,-1.6 -1.275,-1.6 ; -1.6,1.275 -1.6,1.6 -1.275,1.6 ; 1.275,-1.6 1.6,-1.6 1.6,-1.275 ; 1.275,1.6 1.6,1.6 1.6,1.275
Mechanical 13:
  circle w0.1: c-0.675,0.675 r0.5
  lines w0.1: -1.575,-1.575 1.575,-1.575 1.575,1.575 -1.575,1.575 -1.575,-1.575
Mechanical 15:
  lines w0.1: -0.5,0 0.5,0 ; 0,-0.5 0,0.5 ; -2.15,-2.15 2.15,-2.15 2.15,2.15 -2.15,2.15 -2.15,-2.15
3D body: height 0.8, standoff 0, extent -1.575,-1.575 1.575,1.575

## QFN-28_L [mm] "QFN, 28-Leads, Body 4x4mm, Pitch 0.4mm, Thermal Pad 2.5x2.5mm, IPC High Density"
height 0.9
pads (29):
  oval 0.55x0.2 smd: 1(-1.975,1.2) 2(-1.975,0.8) 3(-1.975,0.4) 4(-1.975,0) 5(-1.975,-0.4) 6(-1.975,-0.8) 7(-1.975,-1.2) 15(1.975,-1.2) 16(1.975,-0.8) 17(1.975,-0.4) 18(1.975,0) 19(1.975,0.4) 20(1.975,0.8) 21(1.975,1.2)
  oval 0.2x0.55 smd: 8(-1.2,-1.975) 9(-0.8,-1.975) 10(-0.4,-1.975) 11(0,-1.975) 12(0.4,-1.975) 13(0.8,-1.975) 14(1.2,-1.975) 22(1.2,1.975) 23(0.8,1.975) 24(0.4,1.975) 25(0,1.975) 26(-0.4,1.975) 27(-0.8,1.975) 28(-1.2,1.975)
  rect 2.5x2.5 smd: 29(0,0)
via 0.55,-0.55 diameter 0.5 hole 0.2
via -0.55,-0.55 diameter 0.5 hole 0.2
via 0.55,0.55 diameter 0.5 hole 0.2
via -0.55,0.55 diameter 0.5 hole 0.2
Top Overlay:
  circle w0.25: c-2.825,2.025 r0.125
  lines w0.2: -2.175,-1.7 -2.175,-2.175 -1.7,-2.175 ; -2.175,1.7 -2.175,2.175 -1.7,2.175 ; 1.7,-2.175 2.175,-2.175 2.175,-1.7 ; 1.7,2.175 2.175,2.175 2.175,1.7
Mechanical 13:
  circle w0.1: c-1.125,1.125 r0.5
  lines w0.1: -2.025,-2.025 2.025,-2.025 2.025,2.025 -2.025,2.025 -2.025,-2.025
Mechanical 15:
  lines w0.05: -2.35,-2.35 2.35,-2.35 2.35,2.35 -2.35,2.35 -2.35,-2.35
  lines w0.1: -0.5,0 0.5,0 ; 0,-0.5 0,0.5
3D body: height 0.9, standoff 0, extent -2.025,-2.025 2.025,2.025

## QFN-28_M [mm] "QFN, 28-Leads, Body 4x4mm, Pitch 0.4mm, Thermal Pad 2.5x2.5mm, IPC Low Density"
height 0.9
pads (29):
  oval 0.75x0.2 smd: 1(-2.075,1.2) 2(-2.075,0.8) 3(-2.075,0.4) 4(-2.075,0) 5(-2.075,-0.4) 6(-2.075,-0.8) 7(-2.075,-1.2) 15(2.075,-1.2) 16(2.075,-0.8) 17(2.075,-0.4) 18(2.075,0) 19(2.075,0.4) 20(2.075,0.8) 21(2.075,1.2)
  oval 0.2x0.75 smd: 8(-1.2,-2.075) 9(-0.8,-2.075) 10(-0.4,-2.075) 11(0,-2.075) 12(0.4,-2.075) 13(0.8,-2.075) 14(1.2,-2.075) 22(1.2,2.075) 23(0.8,2.075) 24(0.4,2.075) 25(0,2.075) 26(-0.4,2.075) 27(-0.8,2.075) 28(-1.2,2.075)
  rect 2.5x2.5 smd: 29(0,0)
via -0.55,0.55 diameter 0.5 hole 0.2
via 0.55,0.55 diameter 0.5 hole 0.2
via -0.55,-0.55 diameter 0.5 hole 0.2
via 0.55,-0.55 diameter 0.5 hole 0.2
Top Overlay:
  circle w0.25: c-2.825,2.025 r0.125
  lines w0.2: -2.175,-1.7 -2.175,-2.175 -1.7,-2.175 ; -2.175,1.7 -2.175,2.175 -1.7,2.175 ; 1.7,-2.175 2.175,-2.175 2.175,-1.7 ; 1.7,2.175 2.175,2.175 2.175,1.7
Mechanical 13:
  circle w0.1: c-1.125,1.125 r0.5
  lines w0.1: -2.025,-2.025 -2.025,2.025 2.025,2.025 2.025,-2.025 -2.025,-2.025
Mechanical 15:
  lines w0.05: -2.95,-2.95 -2.95,2.95 2.95,2.95 2.95,-2.95 -2.95,-2.95
  lines w0.1: -0.5,0 0.5,0 ; 0,-0.5 0,0.5
3D body: height 0.9, standoff 0, extent -2.025,-2.025 2.025,2.025

## QFN-28_N [mm] "QFN, 28-Leads, Body 4x4mm, Pitch 0.4mm, Thermal Pad 2.5x2.5mm, IPC Medium Density"
height 0.9
pads (29):
  oval 0.65x0.2 smd: 1(-2.025,1.2) 2(-2.025,0.8) 3(-2.025,0.4) 4(-2.025,0) 5(-2.025,-0.4) 6(-2.025,-0.8) 7(-2.025,-1.2) 15(2.025,-1.2) 16(2.025,-0.8) 17(2.025,-0.4) 18(2.025,0) 19(2.025,0.4) 20(2.025,0.8) 21(2.025,1.2)
  oval 0.2x0.65 smd: 8(-1.2,-2.025) 9(-0.8,-2.025) 10(-0.4,-2.025) 11(0,-2.025) 12(0.4,-2.025) 13(0.8,-2.025) 14(1.2,-2.025) 22(1.2,2.025) 23(0.8,2.025) 24(0.4,2.025) 25(0,2.025) 26(-0.4,2.025) 27(-0.8,2.025) 28(-1.2,2.025)
  rect 2.5x2.5 smd: 29(0,0)
via 0.55,-0.55 diameter 0.5 hole 0.2
via -0.55,-0.55 diameter 0.5 hole 0.2
via 0.55,0.55 diameter 0.5 hole 0.2
via -0.55,0.55 diameter 0.5 hole 0.2
Top Overlay:
  circle w0.25: c-2.825,2.025 r0.125
  lines w0.2: -2.175,-1.7 -2.175,-2.175 -1.7,-2.175 ; -2.175,1.7 -2.175,2.175 -1.7,2.175 ; 1.7,-2.175 2.175,-2.175 2.175,-1.7 ; 1.7,2.175 2.175,2.175 2.175,1.7
Mechanical 13:
  circle w0.1: c-1.125,1.125 r0.5
  lines w0.1: -2.025,-2.025 2.025,-2.025 2.025,2.025 -2.025,2.025 -2.025,-2.025
Mechanical 15:
  lines w0.05: -2.6,-2.6 2.6,-2.6 2.6,2.6 -2.6,2.6 -2.6,-2.6
  lines w0.1: -0.5,0 0.5,0 ; 0,-0.5 0,0.5
3D body: height 0.9, standoff 0, extent -2.025,-2.025 2.025,2.025